# Altium footprint library SWLIB(150721).PcbLib: 348 footprints (part 11 of 22)
Each footprint in its own frame and in the unit in brackets; x right, y up, seen from the top. Pads: shape width x height; smd on the part's side, far side on the other; paste and mask are expansions set on the pad; w line width, h text height; cw(c..) or ccw(c..) is an arc to the next point about the centre after c.
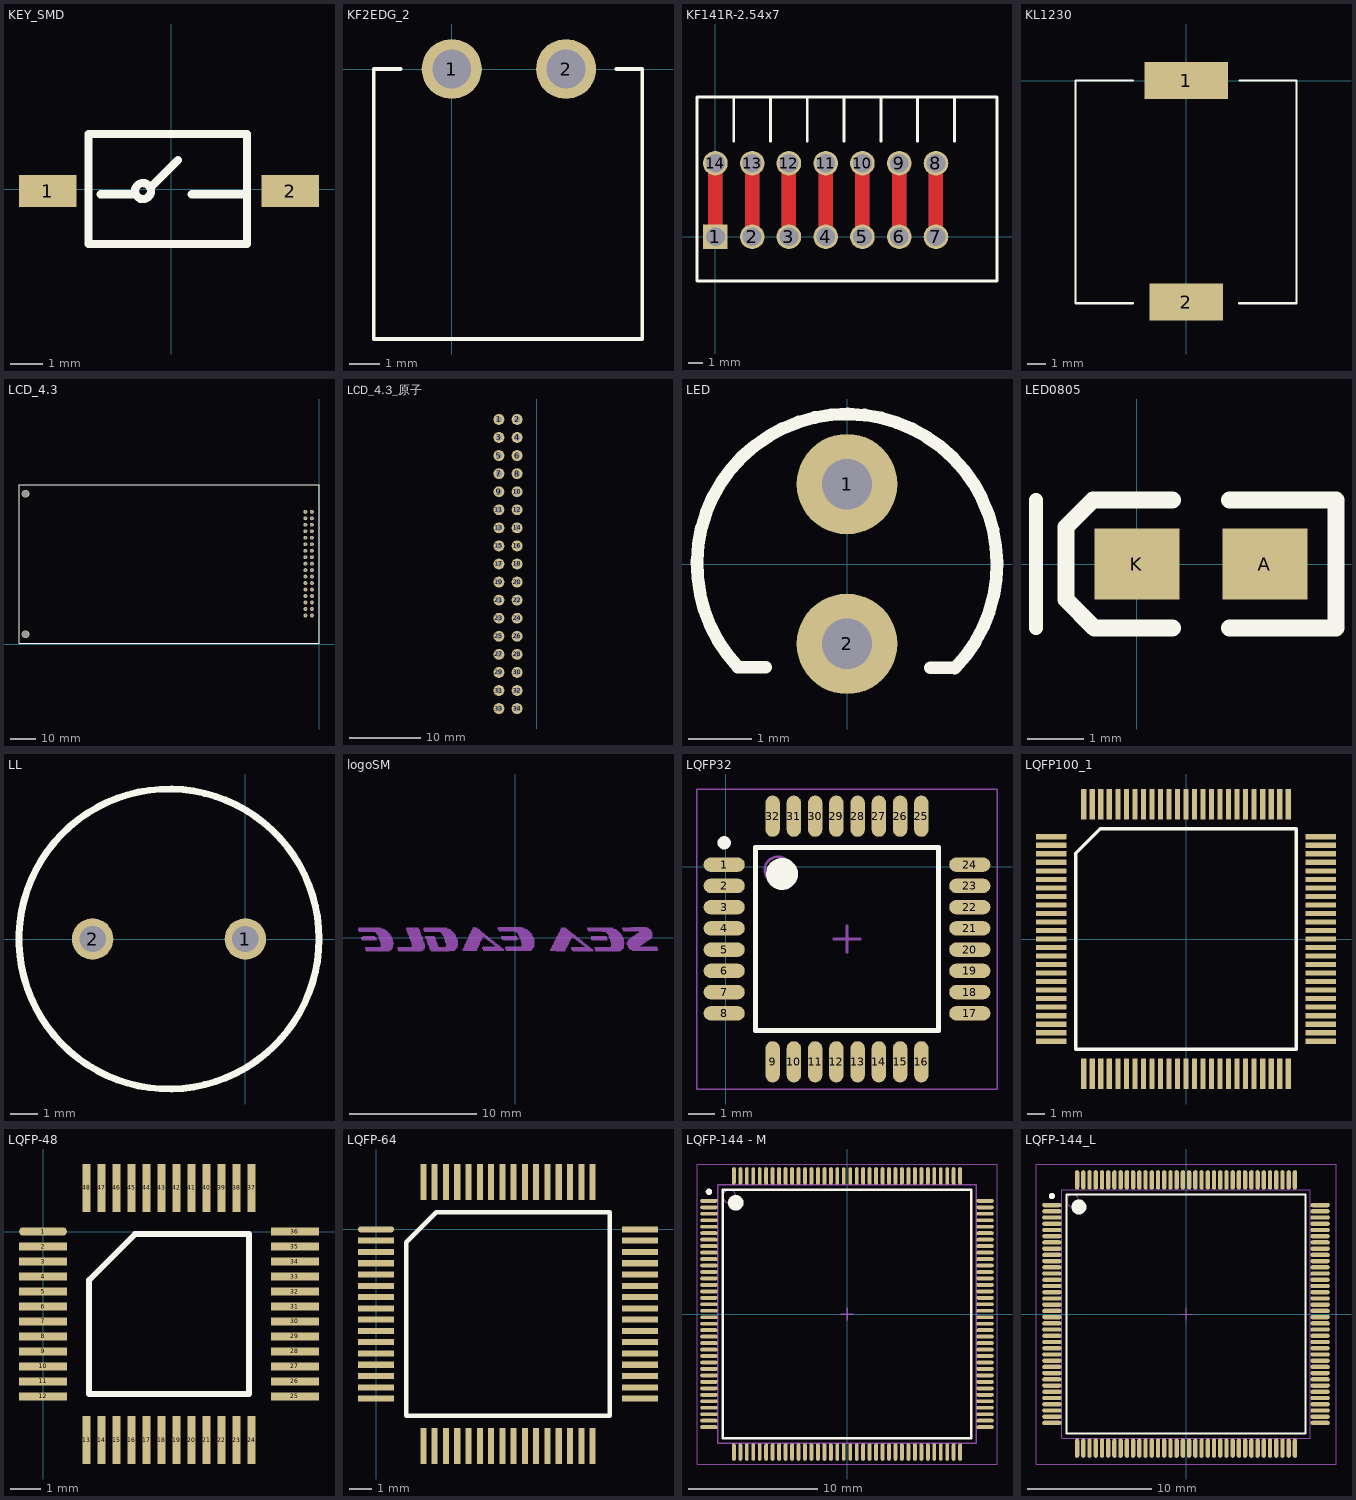
[diagram p10: the footprints below, top view; thin cyan lines are the x and y axes]

## KEY_SMD [mm]
height 5.7
pads (2):
  rect 1.8x1 smd: 1(-3.853,-0.056) 2(3.716,-0.056)
Top Overlay:
  circle w0.254: c-0.881,-0.056 r0.25
  lines w0.254: -2.202,-0.157 -1.313,-0.157 -1.11,-0.157 ; -0.631,0.017 -0.631,-0.056 -0.631,0.067 0.211,0.909 ; 0.643,-0.157 2.243,-0.157 ; -2.583,-1.707 2.37,-1.707 2.37,1.722 -2.583,1.722 -2.583,-1.707
3D body "SW3dPS-TactSwitch_WM-TD-02EC-Y.STEP": height 8.02, standoff -0.98, extent -4.043,-1.783 3.957,1.717

## KF2EDG_2 [mm]
pads (2):
  round 2 hole 1.3: 1(0,0) 2(3.81,0)
Top Overlay:
  lines w0.127: -1.702,0 -2.6,0 -2.6,-9 6.35,-9 6.35,0 5.486,0

## KF141R-2.54x7 [mm]
pads (14):
  rect 1.7x1.7 hole 1.3: 1(0,0)
  round 1.7 hole 1.3: 2(2.54,0) 3(5.08,0) 4(7.62,0) 5(10.16,0) 6(12.7,0) 7(15.24,0) 8(15.24,5.08) 9(12.7,5.08) 10(10.16,5.08) 11(7.62,5.08) 12(5.08,5.08) 13(2.54,5.08) 14(0,5.08)
Top Layer:
  lines w1: 0,0 0,5.08 ; 2.54,0 2.54,5.08 ; 5.08,0 5.08,5.08 ; 7.62,0 7.62,5.08 ; 10.16,0 10.16,5.08 ; 12.7,0 12.7,0.254 12.7,5.08 ; 15.24,0 15.24,0.254 15.24,5.08
Bottom Layer:
  lines w1: 0,0 0,5.08 ; 2.54,0 2.54,5.08 ; 5.08,0.254 5.08,5.08 ; 7.62,0 7.62,5.08 ; 10.16,0 10.16,5.08 ; 12.7,0 12.7,5.08 ; 15.24,0 15.24,5.08
Top Overlay:
  lines w0.2: 1.27,6.604 1.27,9.652 ; 3.81,6.604 3.81,9.652 ; 6.35,6.604 6.35,9.652 ; 8.89,6.604 8.89,9.652 ; 11.43,6.604 11.43,9.652 ; 13.97,6.604 13.97,9.652 ; 16.51,6.604 16.51,9.652 ; -1.27,-3.048 -1.27,9.652 19.456,9.652 19.456,-3.048 -1.27,-3.048

## KL1230 [mm]
pads (2):
  rect 4.5x2 smd: 1(0,0)
  rect 4x2 smd: 2(0,-12)
Top Overlay:
  lines w0.127: -2.896,-12.065 -6,-12.065 -6,0 -2.896,0 ; 2.87,-12.065 5.969,-12.065 5.969,0 2.896,0
3D body: height 1.5, standoff 0.2, extent -5.994,-12.065 6.02,-0.025

## LCD_4.3 [mil] "原子液晶屏"
pads (34):
  round 60 hole 35: 1(-210,2040) 2(-110,2040) 3(-210,1940) 4(-110,1940) 5(-210,1840) 6(-110,1840) 7(-210,1740) 8(-110,1740) 9(-210,1640) 10(-110,1640) 11(-210,1540) 12(-110,1540) 13(-210,1440) 14(-110,1440) 15(-210,1340) 16(-110,1340) 17(-210,1240) 18(-110,1240) 19(-210,1140) 20(-110,1140) 21(-210,1040) 22(-110,1040) 23(-210,940) 24(-110,940) 25(-210,840) 26(-110,840) 27(-210,740) 28(-110,740) 29(-210,640) 30(-110,640) 31(-210,540) 32(-110,540) 33(-210,440) 34(-110,440)
via -4530,2320 diameter 118.11 hole 100
via -4530,150 diameter 118.11 hole 100
Top Overlay:
  lines w8: -4630,10 -4630,2460 0,2460 0,10 -4630,10

## LCD_4.3_原子 [mil] "无丝映"
pads (34):
  round 60 hole 35: 1(-210,2030) 2(-110,2030) 3(-210,1930) 4(-110,1930) 5(-210,1830) 6(-110,1830) 7(-210,1730) 8(-110,1730) 9(-210,1630) 10(-110,1630) 11(-210,1530) 12(-110,1530) 13(-210,1430) 14(-110,1430) 15(-210,1330) 16(-110,1330) 17(-210,1230) 18(-110,1230) 19(-210,1130) 20(-110,1130) 21(-210,1030) 22(-110,1030) 23(-210,930) 24(-110,930) 25(-210,830) 26(-110,830) 27(-210,730) 28(-110,730) 29(-210,630) 30(-110,630) 31(-210,530) 32(-110,530) 33(-210,430) 34(-110,430)
via -4530,140 diameter 118.11 hole 100
via -4530,2310 diameter 118.11 hole 100

## LED [mm] "LED; 2 Leads"
height 2.4
pads (2):
  round 1.6 hole 0.8: 1(0,1.27) 2(0,-1.27)
Top Overlay:
  lines w0.2: -1.295,-1.639 -1.733,-1.639 cw(c0,0) 1.712,-1.661 ; 1.321,-1.651 1.702,-1.651

## LED0805 [mil]
pads (2):
  rect 60x50 smd: A(90,0) K(0,0)
Top Overlay:
  lines w10: -71,-45 -71,45
  lines w12: -50,25 -50,-25 -30,-45 25,-45 ; -50,26 -31,45 25,45 ; 65,-45 140,-45 140,45 65,45

## LL [mil]
pads (2):
  round 60 hole 37.87: 1(0,0) 2(-220.47,0)
Top Overlay:
  circle w10: c-110.24,0 r216.54

## logoSM [mm]
Bottom Overlay:
  drawing of 367 lines, arcs and shapes, not listed
  text "DESIGNED BY" at 15.24,1.6 h1.52

## LQFP32 [mm]
pads (32):
  oval 1.55x0.55 smd: 1(-0.056,0.082) 2(-0.056,-0.718) 3(-0.056,-1.518) 4(-0.056,-2.318) 5(-0.056,-3.118) 6(-0.056,-3.918) 7(-0.056,-4.718) 8(-0.056,-5.518) 17(9.194,-5.518) 18(9.194,-4.718) 19(9.194,-3.918) 20(9.194,-3.118) 21(9.194,-2.318) 22(9.194,-1.518) 23(9.194,-0.718) 24(9.194,0.082)
  oval 0.55x1.55 smd: 9(1.769,-7.343) 10(2.569,-7.343) 11(3.369,-7.343) 12(4.169,-7.343) 13(4.969,-7.343) 14(5.769,-7.343) 15(6.569,-7.343) 16(7.369,-7.343) 25(7.369,1.907) 26(6.569,1.907) 27(5.769,1.907) 28(4.969,1.907) 29(4.169,1.907) 30(3.369,1.907) 31(2.569,1.907) 32(1.769,1.907)
Top Overlay:
  circle w0.25: c-0.056,0.907 r0.125
  circle w0.6: c2.119,-0.268 r0.3
  lines w0.2: 1.119,-6.168 1.119,0.732 8.019,0.732 8.019,-6.168 1.119,-6.168
Mechanical 13:
  circle w0.1: c1.969,-0.118 r0.5
  lines w0.1: 1.069,-6.218 1.069,0.782 8.069,0.782 8.069,-6.218 1.069,-6.218
Mechanical 15:
  lines w0.05: -1.081,-8.368 -1.081,2.932 10.219,2.932 10.219,-8.368 -1.081,-8.368
  lines w0.1: 4.069,-2.718 5.069,-2.718 ; 4.569,-3.218 4.569,-2.218
3D body: height 1.6, standoff 0.1, extent 1.069,-6.218 8.069,0.782

## LQFP100_1 [mm]
pads (100):
  rect 1.8x0.3 smd: 1(-7.9,6) 2(-7.9,5.5) 3(-7.9,5) 4(-7.9,4.5) 5(-7.9,4) 6(-7.9,3.5) 7(-7.9,3) 8(-7.9,2.5) 9(-7.9,2) 10(-7.9,1.5) 11(-7.9,1) 12(-7.9,0.5) 13(-7.9,0) 14(-7.9,-0.5) 15(-7.9,-1) 16(-7.9,-1.5) 17(-7.9,-2) 18(-7.9,-2.5) 19(-7.9,-3) 20(-7.9,-3.5) 21(-7.9,-4) 22(-7.9,-4.5) 23(-7.9,-5) 24(-7.9,-5.5) 25(-7.9,-6) 51(7.9,-6) 52(7.9,-5.5) 53(7.9,-5) 54(7.9,-4.5) 55(7.9,-4) 56(7.9,-3.5) 57(7.9,-3) 58(7.9,-2.5) 59(7.9,-2) 60(7.9,-1.5) 61(7.9,-1) 62(7.9,-0.5) 63(7.9,0) 64(7.9,0.5) 65(7.9,1) 66(7.9,1.5) 67(7.9,2) 68(7.9,2.5) 69(7.9,3) 70(7.9,3.5) 71(7.9,4) 72(7.9,4.5) 73(7.9,5) 74(7.9,5.5) 75(7.9,6)
  rect 0.3x1.8 smd: 26(-6,-7.9) 27(-5.5,-7.9) 28(-5,-7.9) 29(-4.5,-7.9) 30(-4,-7.9) 31(-3.5,-7.9) 32(-3,-7.9) 33(-2.5,-7.9) 34(-2,-7.9) 35(-1.5,-7.9) 36(-1,-7.9) 37(-0.5,-7.9) 38(0,-7.9) 39(0.5,-7.9) 40(1,-7.9) 41(1.5,-7.9) 42(2,-7.9) 43(2.5,-7.9) 44(3,-7.9) 45(3.5,-7.9) 46(4,-7.9) 47(4.5,-7.9) 48(5,-7.9) 49(5.5,-7.9) 50(6,-7.9) 76(6,7.9) 77(5.5,7.9) 78(5,7.9) 79(4.5,7.9) 80(4,7.9) 81(3.5,7.9) 82(3,7.9) 83(2.5,7.9) 84(2,7.9) 85(1.5,7.9) 86(1,7.9) 87(0.5,7.9) 88(0,7.9) 89(-0.5,7.9) 90(-1,7.9) 91(-1.5,7.9) 92(-2,7.9) 93(-2.5,7.9) 94(-3,7.9) 95(-3.5,7.9) 96(-4,7.9) 97(-4.5,7.9) 98(-5,7.9) 99(-5.5,7.9) 100(-6,7.9)
Top Overlay:
  lines w0.2: -6.465,-6.465 -6.465,5.03 -5.03,6.465 6.465,6.465 6.465,-6.465 -6.465,-6.465
3D body: height 2, standoff 0.2, extent -7.722,-7.62 7.645,7.747

## LQFP-48 [mm]
pads (48):
  oval 1.6x0.27 smd: 1(0,0)
  rect 1.6x0.27 smd: 2(0,-0.5) 3(0,-1) 4(0,-1.5) 5(0,-2) 6(0,-2.5) 7(0,-3) 8(0,-3.5) 9(0,-4) 10(0,-4.5) 11(0,-5) 12(0,-5.5) 25(8.4,-5.5) 26(8.4,-5) 27(8.4,-4.5) 28(8.4,-4) 29(8.4,-3.5) 30(8.4,-3) 31(8.4,-2.5) 32(8.4,-2) 33(8.4,-1.5) 34(8.4,-1) 35(8.4,-0.5) 36(8.4,0)
  rect 0.27x1.6 smd: 13(1.45,-6.95) 14(1.95,-6.95) 15(2.45,-6.95) 16(2.95,-6.95) 17(3.45,-6.95) 18(3.95,-6.95) 19(4.45,-6.95) 20(4.95,-6.95) 21(5.45,-6.95) 22(5.95,-6.95) 23(6.45,-6.95) 24(6.95,-6.95) 37(6.95,1.45) 38(6.45,1.45) 39(5.95,1.45) 40(5.45,1.45) 41(4.95,1.45) 42(4.45,1.45) 43(3.95,1.45) 44(3.45,1.45) 45(2.95,1.45) 46(2.45,1.45) 47(1.95,1.45) 48(1.45,1.45)
Top Overlay:
  lines w0.2: 1.535,-5.415 1.535,-1.62 3.07,-0.085 6.865,-0.085 6.865,-5.415 1.535,-5.415

## LQFP-64 [mm]
pads (64):
  oval 1.6x0.27 smd: 1(0,0)
  rect 1.6x0.27 smd: 2(0,-0.5) 3(0,-1) 4(0,-1.5) 5(0,-2) 6(0,-2.5) 7(0,-3) 8(0,-3.5) 9(0,-4) 10(0,-4.5) 11(0,-5) 12(0,-5.5) 13(0,-6) 14(0,-6.5) 15(0,-7) 16(0,-7.5) 33(11.7,-7.5) 34(11.7,-7) 35(11.7,-6.5) 36(11.7,-6) 37(11.7,-5.5) 38(11.7,-5) 39(11.7,-4.5) 40(11.7,-4) 41(11.7,-3.5) 42(11.7,-3) 43(11.7,-2.5) 44(11.7,-2) 45(11.7,-1.5) 46(11.7,-1) 47(11.7,-0.5) 48(11.7,0)
  rect 0.27x1.6 smd: 17(2.1,-9.6) 18(2.6,-9.6) 19(3.1,-9.6) 20(3.6,-9.6) 21(4.1,-9.6) 22(4.6,-9.6) 23(5.1,-9.6) 24(5.6,-9.6) 25(6.1,-9.6) 26(6.6,-9.6) 27(7.1,-9.6) 28(7.6,-9.6) 29(8.1,-9.6) 30(8.6,-9.6) 31(9.1,-9.6) 32(9.6,-9.6) 49(9.6,2.1) 50(9.1,2.1) 51(8.6,2.1) 52(8.1,2.1) 53(7.6,2.1) 54(7.1,2.1) 55(6.6,2.1) 56(6.1,2.1) 57(5.6,2.1) 58(5.1,2.1) 59(4.6,2.1) 60(4.1,2.1) 61(3.6,2.1) 62(3.1,2.1) 63(2.6,2.1) 64(2.1,2.1)
Top Overlay:
  lines w0.2: 1.335,-8.265 1.335,-0.57 2.67,0.765 10.365,0.765 10.365,-8.265 1.335,-8.265

## LQFP-144 - M [mm] "TSQFP, 144-Leads, Body 20.00x20.00mm, Pitch 0.50mm, IPC Medium Density"
height 1.6
pads (144):
  oval 1.35x0.3 smd: 1(-10.675,8.75) 2(-10.675,8.25) 3(-10.675,7.75) 4(-10.675,7.25) 5(-10.675,6.75) 6(-10.675,6.25) 7(-10.675,5.75) 8(-10.675,5.25) 9(-10.675,4.75) 10(-10.675,4.25) 11(-10.675,3.75) 12(-10.675,3.25) 13(-10.675,2.75) 14(-10.675,2.25) 15(-10.675,1.75) 16(-10.675,1.25) 17(-10.675,0.75) 18(-10.675,0.25) 19(-10.675,-0.25) 20(-10.675,-0.75) 21(-10.675,-1.25) 22(-10.675,-1.75) 23(-10.675,-2.25) 24(-10.675,-2.75) 25(-10.675,-3.25) 26(-10.675,-3.75) 27(-10.675,-4.25) 28(-10.675,-4.75) 29(-10.675,-5.25) 30(-10.675,-5.75) 31(-10.675,-6.25) 32(-10.675,-6.75) 33(-10.675,-7.25) 34(-10.675,-7.75) 35(-10.675,-8.25) 36(-10.675,-8.75) 73(10.675,-8.75) 74(10.675,-8.25) 75(10.675,-7.75) 76(10.675,-7.25) 77(10.675,-6.75) 78(10.675,-6.25) 79(10.675,-5.75) 80(10.675,-5.25) 81(10.675,-4.75) 82(10.675,-4.25) 83(10.675,-3.75) 84(10.675,-3.25) 85(10.675,-2.75) 86(10.675,-2.25) 87(10.675,-1.75) 88(10.675,-1.25) 89(10.675,-0.75) 90(10.675,-0.25) 91(10.675,0.25) 92(10.675,0.75) 93(10.675,1.25) 94(10.675,1.75) 95(10.675,2.25) 96(10.675,2.75) 97(10.675,3.25) 98(10.675,3.75) 99(10.675,4.25) 100(10.675,4.75) 101(10.675,5.25) 102(10.675,5.75) 103(10.675,6.25) 104(10.675,6.75) 105(10.675,7.25) 106(10.675,7.75) 107(10.675,8.25) 108(10.675,8.75)
  oval 0.3x1.35 smd: 37(-8.75,-10.675) 38(-8.25,-10.675) 39(-7.75,-10.675) 40(-7.25,-10.675) 41(-6.75,-10.675) 42(-6.25,-10.675) 43(-5.75,-10.675) 44(-5.25,-10.675) 45(-4.75,-10.675) 46(-4.25,-10.675) 47(-3.75,-10.675) 48(-3.25,-10.675) 49(-2.75,-10.675) 50(-2.25,-10.675) 51(-1.75,-10.675) 52(-1.25,-10.675) 53(-0.75,-10.675) 54(-0.25,-10.675) 55(0.25,-10.675) 56(0.75,-10.675) 57(1.25,-10.675) 58(1.75,-10.675) 59(2.25,-10.675) 60(2.75,-10.675) 61(3.25,-10.675) 62(3.75,-10.675) 63(4.25,-10.675) 64(4.75,-10.675) 65(5.25,-10.675) 66(5.75,-10.675) 67(6.25,-10.675) 68(6.75,-10.675) 69(7.25,-10.675) 70(7.75,-10.675) 71(8.25,-10.675) 72(8.75,-10.675) 109(8.75,10.675) 110(8.25,10.675) 111(7.75,10.675) 112(7.25,10.675) 113(6.75,10.675) 114(6.25,10.675) 115(5.75,10.675) 116(5.25,10.675) 117(4.75,10.675) 118(4.25,10.675) 119(3.75,10.675) 120(3.25,10.675) 121(2.75,10.675) 122(2.25,10.675) 123(1.75,10.675) 124(1.25,10.675) 125(0.75,10.675) 126(0.25,10.675) 127(-0.25,10.675) 128(-0.75,10.675) 129(-1.25,10.675) 130(-1.75,10.675) 131(-2.25,10.675) 132(-2.75,10.675) 133(-3.25,10.675) 134(-3.75,10.675) 135(-4.25,10.675) 136(-4.75,10.675) 137(-5.25,10.675) 138(-5.75,10.675) 139(-6.25,10.675) 140(-6.75,10.675) 141(-7.25,10.675) 142(-7.75,10.675) 143(-8.25,10.675) 144(-8.75,10.675)
Top Overlay:
  circle w0.6: c-8.6,8.6 r0.3
  circle w0.25: c-10.675,9.45 r0.125
  lines w0.2: -9.6,-9.6 9.6,-9.6 9.6,9.6 -9.6,9.6 -9.6,-9.6
Mechanical 13:
  circle w0.1: c-9.1,9.1 r0.5
  lines w0.1: -10,-10 10,-10 10,10 -10,10 -10,-10
Mechanical 15:
  lines w0.05: -11.6,-11.6 11.6,-11.6 11.6,11.6 -11.6,11.6 -11.6,-11.6
  lines w0.1: -0.5,0 0.5,0 ; 0,-0.5 0,0.5
3D body: height 1.6, standoff 0.1, extent -10,-10 10,10

## LQFP-144_L [mm] "TSQFP, 144-Leads, Body 20.00x20.00mm, Pitch 0.50mm, IPC Low Density"
height 1.6
pads (144):
  oval 1.55x0.35 smd: 1(-10.775,8.75) 2(-10.775,8.25) 3(-10.775,7.75) 4(-10.775,7.25) 5(-10.775,6.75) 6(-10.775,6.25) 7(-10.775,5.75) 8(-10.775,5.25) 9(-10.775,4.75) 10(-10.775,4.25) 11(-10.775,3.75) 12(-10.775,3.25) 13(-10.775,2.75) 14(-10.775,2.25) 15(-10.775,1.75) 16(-10.775,1.25) 17(-10.775,0.75) 18(-10.775,0.25) 19(-10.775,-0.25) 20(-10.775,-0.75) 21(-10.775,-1.25) 22(-10.775,-1.75) 23(-10.775,-2.25) 24(-10.775,-2.75) 25(-10.775,-3.25) 26(-10.775,-3.75) 27(-10.775,-4.25) 28(-10.775,-4.75) 29(-10.775,-5.25) 30(-10.775,-5.75) 31(-10.775,-6.25) 32(-10.775,-6.75) 33(-10.775,-7.25) 34(-10.775,-7.75) 35(-10.775,-8.25) 36(-10.775,-8.75) 73(10.775,-8.75) 74(10.775,-8.25) 75(10.775,-7.75) 76(10.775,-7.25) 77(10.775,-6.75) 78(10.775,-6.25) 79(10.775,-5.75) 80(10.775,-5.25) 81(10.775,-4.75) 82(10.775,-4.25) 83(10.775,-3.75) 84(10.775,-3.25) 85(10.775,-2.75) 86(10.775,-2.25) 87(10.775,-1.75) 88(10.775,-1.25) 89(10.775,-0.75) 90(10.775,-0.25) 91(10.775,0.25) 92(10.775,0.75) 93(10.775,1.25) 94(10.775,1.75) 95(10.775,2.25) 96(10.775,2.75) 97(10.775,3.25) 98(10.775,3.75) 99(10.775,4.25) 100(10.775,4.75) 101(10.775,5.25) 102(10.775,5.75) 103(10.775,6.25) 104(10.775,6.75) 105(10.775,7.25) 106(10.775,7.75) 107(10.775,8.25) 108(10.775,8.75)
  oval 0.35x1.55 smd: 37(-8.75,-10.775) 38(-8.25,-10.775) 39(-7.75,-10.775) 40(-7.25,-10.775) 41(-6.75,-10.775) 42(-6.25,-10.775) 43(-5.75,-10.775) 44(-5.25,-10.775) 45(-4.75,-10.775) 46(-4.25,-10.775) 47(-3.75,-10.775) 48(-3.25,-10.775) 49(-2.75,-10.775) 50(-2.25,-10.775) 51(-1.75,-10.775) 52(-1.25,-10.775) 53(-0.75,-10.775) 54(-0.25,-10.775) 55(0.25,-10.775) 56(0.75,-10.775) 57(1.25,-10.775) 58(1.75,-10.775) 59(2.25,-10.775) 60(2.75,-10.775) 61(3.25,-10.775) 62(3.75,-10.775) 63(4.25,-10.775) 64(4.75,-10.775) 65(5.25,-10.775) 66(5.75,-10.775) 67(6.25,-10.775) 68(6.75,-10.775) 69(7.25,-10.775) 70(7.75,-10.775) 71(8.25,-10.775) 72(8.75,-10.775) 109(8.75,10.775) 110(8.25,10.775) 111(7.75,10.775) 112(7.25,10.775) 113(6.75,10.775) 114(6.25,10.775) 115(5.75,10.775) 116(5.25,10.775) 117(4.75,10.775) 118(4.25,10.775) 119(3.75,10.775) 120(3.25,10.775) 121(2.75,10.775) 122(2.25,10.775) 123(1.75,10.775) 124(1.25,10.775) 125(0.75,10.775) 126(0.25,10.775) 127(-0.25,10.775) 128(-0.75,10.775) 129(-1.25,10.775) 130(-1.75,10.775) 131(-2.25,10.775) 132(-2.75,10.775) 133(-3.25,10.775) 134(-3.75,10.775) 135(-4.25,10.775) 136(-4.75,10.775) 137(-5.25,10.775) 138(-5.75,10.775) 139(-6.25,10.775) 140(-6.75,10.775) 141(-7.25,10.775) 142(-7.75,10.775) 143(-8.25,10.775) 144(-8.75,10.775)
Top Overlay:
  circle w0.25: c-10.775,9.475 r0.125
  circle w0.6: c-8.6,8.6 r0.3
  lines w0.2: -9.6,-9.6 -9.6,9.6 9.6,9.6 9.6,-9.6 -9.6,-9.6
Mechanical 13:
  circle w0.1: c-9.1,9.1 r0.5
  lines w0.1: -10,-10 -10,10 10,10 10,-10 -10,-10
Mechanical 15:
  lines w0.05: -12.05,-12.05 -12.05,12.05 12.05,12.05 12.05,-12.05 -12.05,-12.05
  lines w0.1: -0.5,0 0.5,0 ; 0,-0.5 0,0.5
3D body: height 1.6, standoff 0.1, extent -10,-10 10,10